# Altium footprint library FCI THD.PcbLib: 30 footprints (part 2 of 2)
Each footprint in its own frame and in the unit in brackets; x right, y up, seen from the top. Pads: shape width x height; smd on the part's side, far side on the other; paste and mask are expansions set on the pad; w line width, h text height; cw(c..) or ccw(c..) is an arc to the next point about the centre after c.
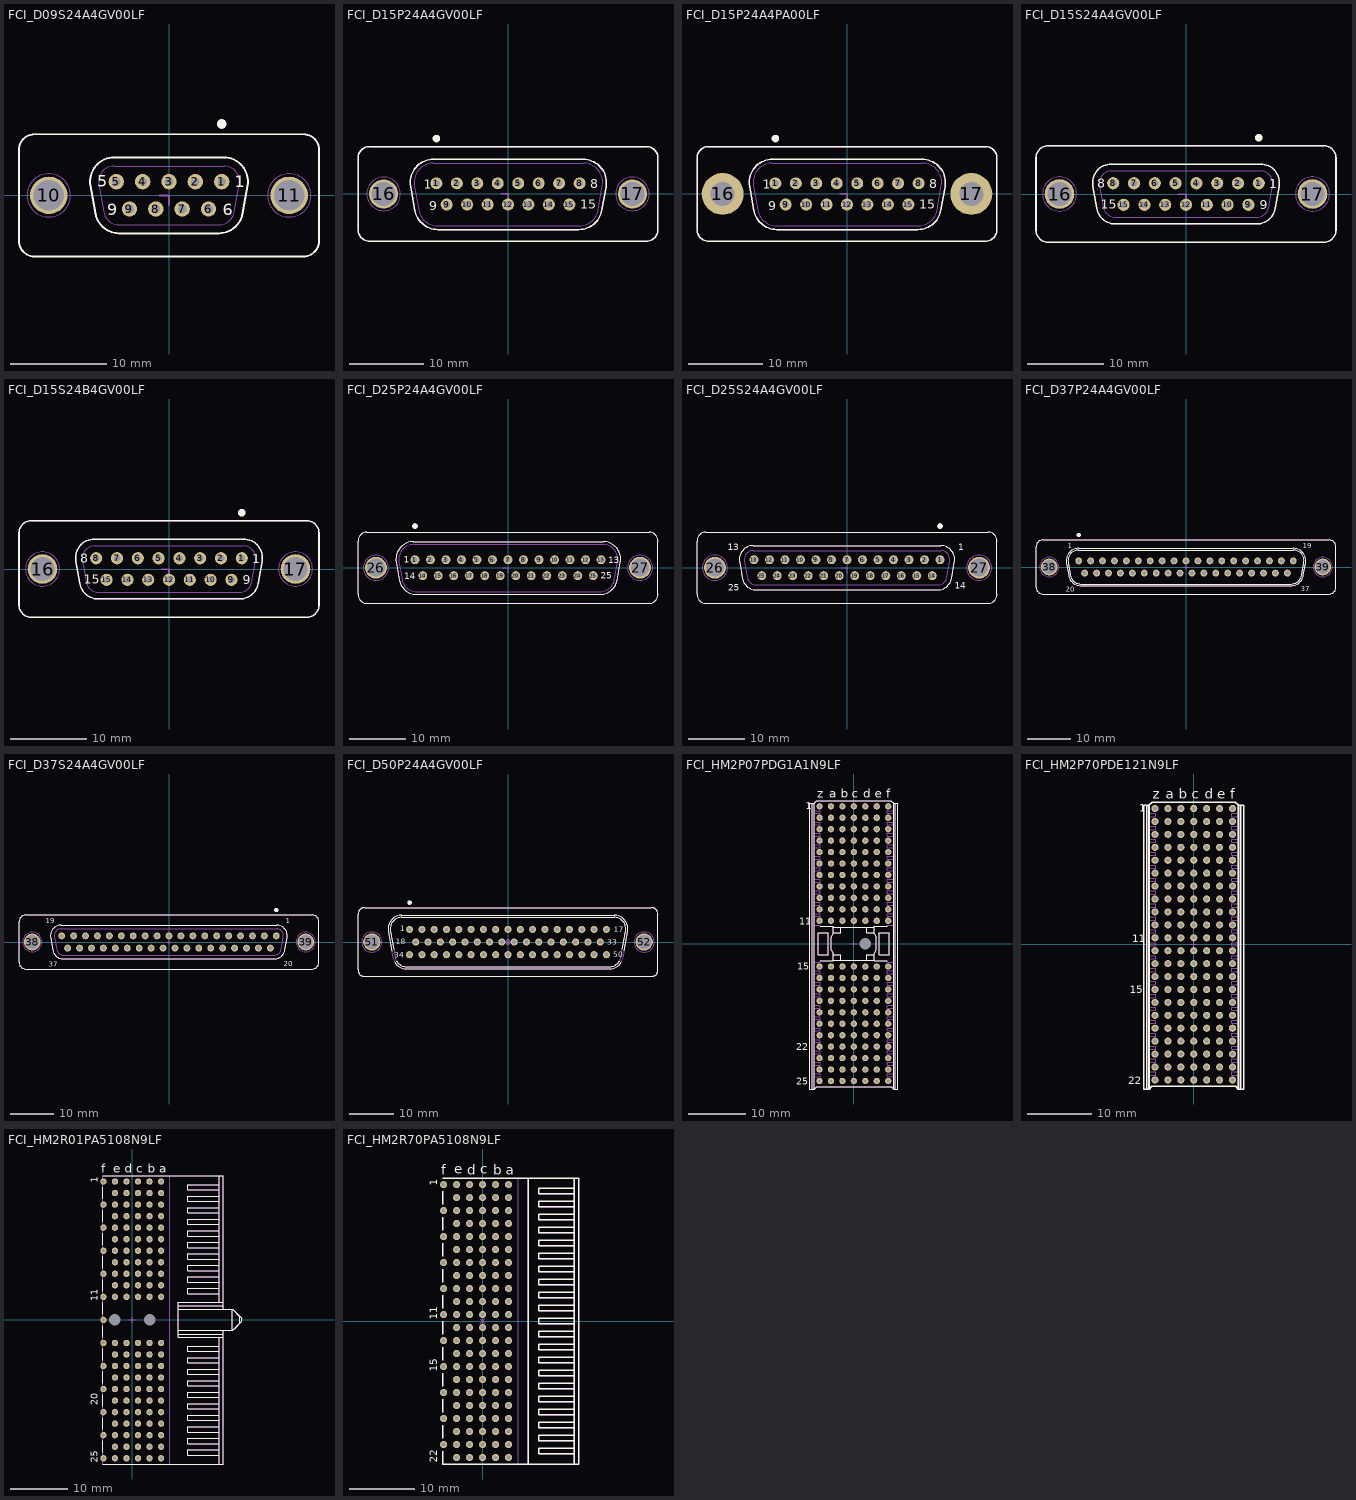
[diagram p1: the footprints below, top view; thin cyan lines are the x and y axes]

## FCI_D09S24A4GV00LF [mm] "Straight D-SUB 9 Female Contacts for PCB  with Harpoons and Female Screwlock (UNC4-40) and Elec. Continuity"
height 12.39
pads (11):
  round 1.6 hole 0.9: 1(5.48,1.42) 2(2.74,1.42) 3(0,1.42) 4(-2.74,1.42) 5(-5.48,1.42) 6(4.11,-1.42) 7(1.37,-1.42) 8(-1.37,-1.42) 9(-4.11,-1.42)
  round 3.9 hole 3.2: 10(-12.495,0) 11(12.495,0)
Top Overlay:
  circle w0.5: c5.48,7.42 r0.25
  lines w0.2: -15.595,-4.75 ccw(c-13.995,-4.75) -13.995,-6.35 13.995,-6.35 ccw(c13.995,-4.75) 15.595,-4.75 15.595,4.75 ccw(c13.995,4.75) 13.995,6.35 -13.995,6.35 ccw(c-13.995,4.75) -15.595,4.75 -15.595,-4.75 ; -8.167,1.011 cw(c-5.705,1.445) -5.705,3.945 5.705,3.945 cw(c5.705,1.445) 8.167,1.011 7.657,-1.879 cw(c5.195,-1.445) 5.195,-3.945 -5.195,-3.945 cw(c-5.195,-1.445) -7.657,-1.879 -8.167,1.011
  text "1" at 6.855,0.82 h1.2
  text "5" at -7.48,0.895 h1.2
  text "6" at 5.585,-2.045 h1.2
  text "9" at -6.41,-2.045 h1.2
Mechanical 8:
  lines w0.2: -1,0 0,0 0,-1
Mechanical 14:
  circle w0.1: c12.495,0 r2.25
  circle w0.1: c-12.495,0 r2.25
  lines w0.1: -15.595,-4.75 ccw(c-13.995,-4.75) -13.995,-6.35 13.995,-6.35 ccw(c13.995,-4.75) 15.595,-4.75 15.595,4.75 ccw(c13.995,4.75) 13.995,6.35 -13.995,6.35 ccw(c-13.995,4.75) -15.595,4.75 -15.595,-4.75 ; -8.167,1.011 cw(c-5.705,1.445) -5.705,3.945 5.705,3.945 cw(c5.705,1.445) 8.167,1.011 7.657,-1.879 cw(c5.195,-1.445) 5.195,-3.945 -5.195,-3.945 cw(c-5.195,-1.445) -7.657,-1.879 -8.167,1.011 ; -7.291,1.167 cw(c-5.715,1.445) -5.715,3.045 5.715,3.045 cw(c5.715,1.445) 7.291,1.167 6.781,-1.723 cw(c5.205,-1.445) 5.205,-3.045 -5.205,-3.045 cw(c-5.205,-1.445) -6.781,-1.723 -7.291,1.167
  text "9 D-Sub Female" at -6.178,4.472 h1.2
  text "9" at -9.5,-2.025 h1.2
  text "6" at 8.525,-2.05 h1.2
  text "5" at -9.525,1 h1.2
  text "1" at 8.85,1 h1.2
3D body "FCI_D09S24A4GV00LF.stp": height 12.1, standoff -3, extent -15.495,-6.653 15.495,6.21

## FCI_D15P24A4GV00LF [mm] "Straight D-SUB 15 Male Contacts for PCB  with Harpoons and Female Screwlock (UNC4-40) and Elec. Continuity"
height 12.25
pads (17):
  round 1.6 hole 0.9: 1(-9.59,1.42) 2(-6.85,1.42) 3(-4.11,1.42) 4(-1.37,1.42) 5(1.37,1.42) 6(4.11,1.42) 7(6.85,1.42) 8(9.59,1.42) 9(-8.22,-1.42) 10(-5.48,-1.42) 11(-2.74,-1.42) 12(0,-1.42) 13(2.74,-1.42) 14(5.48,-1.42) 15(8.22,-1.42)
  round 3.9 hole 3.2: 16(-16.66,0) 17(16.66,0)
Top Overlay:
  circle w0.5: c-9.59,7.42 r0.25
  lines w0.2: -20.095,-4.75 ccw(c-18.495,-4.75) -18.495,-6.35 18.495,-6.35 ccw(c18.495,-4.75) 20.095,-4.75 20.095,4.75 ccw(c18.495,4.75) 18.495,6.35 -18.495,6.35 ccw(c-18.495,4.75) -20.095,4.75 -20.095,-4.75 ; -13.038,0.978 cw(c-9.965,1.52) -9.965,4.64 10.065,4.64 cw(c10.065,1.52) 13.138,0.978 12.579,-2.192 cw(c9.506,-1.65) 9.506,-4.77 -9.406,-4.77 cw(c-9.406,-1.65) -12.479,-2.192 -13.038,0.978
  text "8" at 11.04,0.77 h1.2
  text "9" at -10.52,-2.17 h1.2
  text "1" at -11.29,0.67 h1.2
  text "15" at 9.695,-1.995 h1.2
Mechanical 8:
  lines w0.2: -1,0 0,0 0,-1
Mechanical 14:
  circle w0.1: c-16.66,0 r2.25
  circle w0.1: c16.66,0 r2.25
  lines w0.1: -20.095,-4.75 ccw(c-18.495,-4.75) -18.495,-6.35 18.495,-6.35 ccw(c18.495,-4.75) 20.095,-4.75 20.095,4.75 ccw(c18.495,4.75) 18.495,6.35 -18.495,6.35 ccw(c-18.495,4.75) -20.095,4.75 -20.095,-4.75 ; -13.038,0.978 cw(c-9.965,1.52) -9.965,4.64 10.065,4.64 cw(c10.065,1.52) 13.138,0.978 12.579,-2.192 cw(c9.506,-1.65) 9.506,-4.77 -9.406,-4.77 cw(c-9.406,-1.65) -12.479,-2.192 -13.038,0.978 ; -12.545,1.065 cw(c-9.965,1.52) -9.965,4.14 10.065,4.14 cw(c10.065,1.52) 12.645,1.065 12.086,-2.105 cw(c9.506,-1.65) 9.506,-4.27 -9.406,-4.27 cw(c-9.406,-1.65) -11.986,-2.105 -12.545,1.065
  text "15 D-Sub Male" at -6.028,4.847 h1.2
  text "15" at 9.695,-1.995 h1.2
  text "1" at -11.29,0.67 h1.2
  text "9" at -10.52,-2.17 h1.2
  text "8" at 11.04,0.77 h1.2
3D body "FCI_D15P24A4GV00LF.stp": height 12, standoff -3, extent -19.66,-6.275 19.66,6.275

## FCI_D15P24A4PA00LF [mm] "Straight D-SUB 15 Male Contacts for PCB  without Harpoons and without Female Screwlock"
height 12.25
pads (17):
  round 1.6 hole 0.9: 1(-9.59,1.42) 2(-6.85,1.42) 3(-4.11,1.42) 4(-1.37,1.42) 5(1.37,1.42) 6(4.11,1.42) 7(6.85,1.42) 8(9.59,1.42) 9(-8.22,-1.42) 10(-5.48,-1.42) 11(-2.74,-1.42) 12(0,-1.42) 13(2.74,-1.42) 14(5.48,-1.42) 15(8.22,-1.42)
  round 5.6 hole 3.2: 16(-16.66,0) 17(16.66,0)
Top Overlay:
  circle w0.5: c-9.59,7.42 r0.25
  lines w0.2: -20.095,-4.75 ccw(c-18.495,-4.75) -18.495,-6.35 18.495,-6.35 ccw(c18.495,-4.75) 20.095,-4.75 20.095,4.75 ccw(c18.495,4.75) 18.495,6.35 -18.495,6.35 ccw(c-18.495,4.75) -20.095,4.75 -20.095,-4.75 ; -13.038,0.978 cw(c-9.965,1.52) -9.965,4.64 10.065,4.64 cw(c10.065,1.52) 13.138,0.978 12.579,-2.192 cw(c9.506,-1.65) 9.506,-4.77 -9.406,-4.77 cw(c-9.406,-1.65) -12.479,-2.192 -13.038,0.978
  text "8" at 11.04,0.77 h1.2
  text "9" at -10.52,-2.17 h1.2
  text "1" at -11.29,0.67 h1.2
  text "15" at 9.695,-1.995 h1.2
Mechanical 8:
  lines w0.2: -1,0 0,0 0,-1
Mechanical 14:
  circle w0.1: c-16.66,0 r2.25
  circle w0.1: c16.66,0 r2.25
  lines w0.1: -20.095,-4.75 ccw(c-18.495,-4.75) -18.495,-6.35 18.495,-6.35 ccw(c18.495,-4.75) 20.095,-4.75 20.095,4.75 ccw(c18.495,4.75) 18.495,6.35 -18.495,6.35 ccw(c-18.495,4.75) -20.095,4.75 -20.095,-4.75 ; -13.038,0.978 cw(c-9.965,1.52) -9.965,4.64 10.065,4.64 cw(c10.065,1.52) 13.138,0.978 12.579,-2.192 cw(c9.506,-1.65) 9.506,-4.77 -9.406,-4.77 cw(c-9.406,-1.65) -12.479,-2.192 -13.038,0.978 ; -12.545,1.065 cw(c-9.965,1.52) -9.965,4.14 10.065,4.14 cw(c10.065,1.52) 12.645,1.065 12.086,-2.105 cw(c9.506,-1.65) 9.506,-4.27 -9.406,-4.27 cw(c-9.406,-1.65) -11.986,-2.105 -12.545,1.065
  text "15 D-Sub Male" at -6.028,4.847 h1.2
  text "15" at 9.695,-1.995 h1.2
  text "1" at -11.29,0.67 h1.2
  text "9" at -10.52,-2.17 h1.2
  text "8" at 11.04,0.77 h1.2
3D body "FCI_D15P24A4PA00LF.stp": height 11.9, standoff -2, extent -19.66,-6.275 19.66,6.275

## FCI_D15S24A4GV00LF [mm] "Straight D-SUB 15 Female Contacts for PCB  with Harpoons and Female Screwlock (UNC4-40) and Elec. Continuity"
height 12.39
pads (17):
  round 1.6 hole 0.9: 1(9.59,1.42) 2(6.85,1.42) 3(4.11,1.42) 4(1.37,1.42) 5(-1.37,1.42) 6(-4.11,1.42) 7(-6.85,1.42) 8(-9.59,1.42) 9(8.22,-1.42) 10(5.48,-1.42) 11(2.74,-1.42) 12(0,-1.42) 13(-2.74,-1.42) 14(-5.48,-1.42) 15(-8.22,-1.42)
  round 3.9 hole 3.2: 16(-16.66,0) 17(16.66,0)
Top Overlay:
  circle w0.5: c9.59,7.42 r0.25
  lines w0.2: -19.76,-4.75 ccw(c-18.16,-4.75) -18.16,-6.35 18.16,-6.35 ccw(c18.16,-4.75) 19.76,-4.75 19.76,4.75 ccw(c18.16,4.75) 18.16,6.35 -18.16,6.35 ccw(c-18.16,4.75) -19.76,4.75 -19.76,-4.75 ; -12.277,1.011 cw(c-9.815,1.445) -9.815,3.945 9.815,3.945 cw(c9.815,1.445) 12.277,1.011 11.767,-1.879 cw(c9.305,-1.445) 9.305,-3.945 -9.305,-3.945 cw(c-9.305,-1.445) -11.767,-1.879 -12.277,1.011
  text "15" at -11.22,-1.945 h1.2
  text "8" at -11.69,0.82 h1.2
  text "1" at 10.965,0.77 h1.2
  text "9" at 9.695,-1.995 h1.2
Mechanical 8:
  lines w0.2: -1,0 0,0 0,-1
Mechanical 14:
  circle w0.1: c16.66,0 r2.25
  circle w0.1: c-16.66,0 r2.25
  lines w0.1: -19.76,-4.75 ccw(c-18.16,-4.75) -18.16,-6.35 18.16,-6.35 ccw(c18.16,-4.75) 19.76,-4.75 19.76,4.75 ccw(c18.16,4.75) 18.16,6.35 -18.16,6.35 ccw(c-18.16,4.75) -19.76,4.75 -19.76,-4.75 ; -12.277,1.011 cw(c-9.815,1.445) -9.815,3.945 9.815,3.945 cw(c9.815,1.445) 12.277,1.011 11.767,-1.879 cw(c9.305,-1.445) 9.305,-3.945 -9.305,-3.945 cw(c-9.305,-1.445) -11.767,-1.879 -12.277,1.011 ; -11.401,1.167 cw(c-9.825,1.445) -9.825,3.045 9.825,3.045 cw(c9.825,1.445) 11.401,1.167 10.891,-1.723 cw(c9.315,-1.445) 9.315,-3.045 -9.315,-3.045 cw(c-9.315,-1.445) -10.891,-1.723 -11.401,1.167
  text "15 D-Sub Female" at -6.278,4.522 h1.2
  text "9" at 12.845,-2.07 h1.2
  text "1" at 12.99,1.095 h1.2
  text "8" at -13.715,0.945 h1.2
  text "15" at -14.17,-2.045 h1.2
3D body "FCI_D15S24A4GV00LF.stp": height 12.1, standoff -3, extent -19.66,-6.275 19.66,6.275

## FCI_D15S24B4GV00LF [mm] "Straight D-SUB 15 Female Contacts for PCB  with Harpoons and Female Screwlock (UNC4-40) and Elec. Continuity"
height 12.39
pads (17):
  round 1.6 hole 0.9: 1(9.59,1.42) 2(6.85,1.42) 3(4.11,1.42) 4(1.37,1.42) 5(-1.37,1.42) 6(-4.11,1.42) 7(-6.85,1.42) 8(-9.59,1.42) 9(8.22,-1.42) 10(5.48,-1.42) 11(2.74,-1.42) 12(0,-1.42) 13(-2.74,-1.42) 14(-5.48,-1.42) 15(-8.22,-1.42)
  round 3.9 hole 3.2: 16(-16.66,0) 17(16.66,0)
Top Overlay:
  circle w0.5: c9.59,7.42 r0.25
  lines w0.2: -19.76,-4.75 ccw(c-18.16,-4.75) -18.16,-6.35 18.16,-6.35 ccw(c18.16,-4.75) 19.76,-4.75 19.76,4.75 ccw(c18.16,4.75) 18.16,6.35 -18.16,6.35 ccw(c-18.16,4.75) -19.76,4.75 -19.76,-4.75 ; -12.277,1.011 cw(c-9.815,1.445) -9.815,3.945 9.815,3.945 cw(c9.815,1.445) 12.277,1.011 11.767,-1.879 cw(c9.305,-1.445) 9.305,-3.945 -9.305,-3.945 cw(c-9.305,-1.445) -11.767,-1.879 -12.277,1.011
  text "15" at -11.22,-1.945 h1.2
  text "8" at -11.69,0.82 h1.2
  text "1" at 10.965,0.77 h1.2
  text "9" at 9.695,-1.995 h1.2
Mechanical 8:
  lines w0.2: -1,0 0,0 0,-1
Mechanical 14:
  circle w0.1: c16.66,0 r2.25
  circle w0.1: c-16.66,0 r2.25
  lines w0.1: -19.76,-4.75 ccw(c-18.16,-4.75) -18.16,-6.35 18.16,-6.35 ccw(c18.16,-4.75) 19.76,-4.75 19.76,4.75 ccw(c18.16,4.75) 18.16,6.35 -18.16,6.35 ccw(c-18.16,4.75) -19.76,4.75 -19.76,-4.75 ; -12.277,1.011 cw(c-9.815,1.445) -9.815,3.945 9.815,3.945 cw(c9.815,1.445) 12.277,1.011 11.767,-1.879 cw(c9.305,-1.445) 9.305,-3.945 -9.305,-3.945 cw(c-9.305,-1.445) -11.767,-1.879 -12.277,1.011 ; -11.401,1.167 cw(c-9.825,1.445) -9.825,3.045 9.825,3.045 cw(c9.825,1.445) 11.401,1.167 10.891,-1.723 cw(c9.315,-1.445) 9.315,-3.045 -9.315,-3.045 cw(c-9.315,-1.445) -10.891,-1.723 -11.401,1.167
  text "15 D-Sub Female" at -6.278,4.522 h1.2
  text "9" at 12.845,-2.07 h1.2
  text "1" at 12.99,1.095 h1.2
  text "8" at -13.715,0.945 h1.2
  text "15" at -14.17,-2.045 h1.2
3D body "FCI_D15S24B4GV00LF.stp": height 12.1, standoff -4, extent -19.66,-6.275 19.66,6.275

## FCI_D25P24A4GV00LF [mm] "Straight D-SUB 25 Male Contacts for PCB  with Harpoons and Female Screwlock (UNC4-40) and Elec. Continuity"
height 12.05
pads (27):
  round 1.6 hole 0.9: 1(-16.56,1.42) 2(-13.8,1.42) 3(-11.04,1.42) 4(-8.28,1.42) 5(-5.52,1.42) 6(-2.76,1.42) 7(0,1.42) 8(2.76,1.42) 9(5.52,1.42) 10(8.28,1.42) 11(11.04,1.42) 12(13.8,1.42) 13(16.56,1.42) 14(-15.18,-1.42) 15(-12.42,-1.42) 16(-9.66,-1.42) 17(-6.9,-1.42) 18(-4.14,-1.42) 19(-1.38,-1.42) 20(1.38,-1.42) 21(4.14,-1.42) 22(6.9,-1.42) 23(9.66,-1.42) 24(12.42,-1.42) 25(15.18,-1.42)
  round 3.9 hole 3.2: 26(-23.52,0) 27(23.52,0)
Top Overlay:
  circle w0.5: c-16.56,7.42 r0.25
  lines w0.2: -26.705,-4.75 ccw(c-25.105,-4.75) -25.105,-6.35 25.105,-6.35 ccw(c25.105,-4.75) 26.705,-4.75 26.705,4.75 ccw(c25.105,4.75) 25.105,6.35 -25.105,6.35 ccw(c-25.105,4.75) -26.705,4.75 -26.705,-4.75 ; -19.903,0.978 cw(c-16.83,1.52) -16.83,4.64 16.93,4.64 cw(c16.93,1.52) 20.003,0.978 19.444,-2.192 cw(c16.371,-1.65) 16.371,-4.77 -16.271,-4.77 cw(c-16.271,-1.65) -19.344,-2.192 -19.903,0.978
  text "14" at -18.475,-2.05 h1.2
  text "13" at 17.825,0.825 h1.2
  text "1" at -18.575,0.85 h1.2
  text "25" at 16.55,-1.925 h1.2
Mechanical 8:
  lines w0.2: -1,0 0,0 0,-1
Mechanical 14:
  circle w0.1: c-23.52,0 r2.25
  circle w0.1: c23.52,0 r2.25
  lines w0.1: -26.705,-4.75 ccw(c-25.105,-4.75) -25.105,-6.35 25.105,-6.35 ccw(c25.105,-4.75) 26.705,-4.75 26.705,4.75 ccw(c25.105,4.75) 25.105,6.35 -25.105,6.35 ccw(c-25.105,4.75) -26.705,4.75 -26.705,-4.75 ; -19.903,0.978 cw(c-16.83,1.52) -16.83,4.64 16.93,4.64 cw(c16.93,1.52) 20.003,0.978 19.444,-2.192 cw(c16.371,-1.65) 16.371,-4.77 -16.271,-4.77 cw(c-16.271,-1.65) -19.344,-2.192 -19.903,0.978 ; -19.41,1.065 cw(c-16.83,1.52) -16.83,4.14 16.93,4.14 cw(c16.93,1.52) 19.51,1.065 18.951,-2.105 cw(c16.371,-1.65) 16.371,-4.27 -16.271,-4.27 cw(c-16.271,-1.65) -18.851,-2.105 -19.41,1.065
  text "25" at 16.55,-1.925 h1.2
  text "1" at -18.575,0.85 h1.2
  text "13" at 17.5,0.875 h1.2
  text "14" at -18.475,-2.05 h1.2
  text "25 D-Sub Male" at -6.478,4.872 h1.2
3D body "FCI_D25P24A4GV00LF.stp": height 12, standoff -3, extent -26.52,-6.275 26.52,6.275

## FCI_D25S24A4GV00LF [mm] "Straight D-SUB 25 Female Contacts for PCB  with Harpoons and Female Screwlock (UNC4-40) and Elec. Continuity"
height 12.39
pads (27):
  round 1.6 hole 0.9: 1(16.56,1.42) 2(13.8,1.42) 3(11.04,1.42) 4(8.28,1.42) 5(5.52,1.42) 6(2.76,1.42) 7(0,1.42) 8(-2.76,1.42) 9(-5.52,1.42) 10(-8.28,1.42) 11(-11.04,1.42) 12(-13.8,1.42) 13(-16.56,1.42) 14(15.18,-1.42) 15(12.42,-1.42) 16(9.66,-1.42) 17(6.9,-1.42) 18(4.14,-1.42) 19(1.38,-1.42) 20(-1.38,-1.42) 21(-4.14,-1.42) 22(-6.9,-1.42) 23(-9.66,-1.42) 24(-12.42,-1.42) 25(-15.18,-1.42)
  round 3.9 hole 3.2: 26(-23.52,0) 27(23.52,0)
Top Overlay:
  circle w0.5: c16.56,7.42 r0.25
  lines w0.2: -26.705,-4.75 ccw(c-25.105,-4.75) -25.105,-6.35 25.105,-6.35 ccw(c25.105,-4.75) 26.705,-4.75 26.705,4.75 ccw(c25.105,4.75) 25.105,6.35 -25.105,6.35 ccw(c-25.105,4.75) -26.705,4.75 -26.705,-4.75 ; -19.137,1.011 cw(c-16.675,1.445) -16.675,3.945 16.675,3.945 cw(c16.675,1.445) 19.137,1.011 18.627,-1.879 cw(c16.165,-1.445) 16.165,-3.945 -16.165,-3.945 cw(c-16.165,-1.445) -18.627,-1.879 -19.137,1.011
  text "13" at -21.225,3.125 h1.2
  text "1" at 19.775,3.1 h1.2
  text "14" at 19.2,-3.75 h1.2
  text "25" at -21.1,-4.1 h1.2
Mechanical 8:
  lines w0.2: -1,0 0,0 0,-1
Mechanical 14:
  circle w0.1: c23.52,0 r2.25
  circle w0.1: c-23.52,0 r2.25
  lines w0.1: -26.705,-4.75 ccw(c-25.105,-4.75) -25.105,-6.35 25.105,-6.35 ccw(c25.105,-4.75) 26.705,-4.75 26.705,4.75 ccw(c25.105,4.75) 25.105,6.35 -25.105,6.35 ccw(c-25.105,4.75) -26.705,4.75 -26.705,-4.75 ; -19.137,1.011 cw(c-16.675,1.445) -16.675,3.945 16.675,3.945 cw(c16.675,1.445) 19.137,1.011 18.627,-1.879 cw(c16.165,-1.445) 16.165,-3.945 -16.165,-3.945 cw(c-16.165,-1.445) -18.627,-1.879 -19.137,1.011 ; -18.261,1.167 cw(c-16.685,1.445) -16.685,3.045 16.685,3.045 cw(c16.685,1.445) 18.261,1.167 17.751,-1.723 cw(c16.175,-1.445) 16.175,-3.045 -16.175,-3.045 cw(c-16.175,-1.445) -17.751,-1.723 -18.261,1.167
  text "25 D-Sub Female" at -6.328,4.497 h1.2
  text "25" at -21.1,-4.1 h1.2
  text "14" at 19.2,-3.75 h1.2
  text "1" at 19.775,3.1 h1.2
  text "13" at -21.225,3.125 h1.2
3D body "FCI_D25S24A4GV00LF.stp": height 12.1, standoff -3, extent -26.52,-6.275 26.52,6.275

## FCI_D37P24A4GV00LF [mm] "Straight D-SUB 37 Male Contacts for PCB  with Harpoons and Female Screwlock (UNC4-40) and Elec. Continuity"
height 12.05
pads (39):
  round 1.6 hole 0.9: 1(-24.93,1.42) 2(-22.16,1.42) 3(-19.39,1.42) 4(-16.62,1.42) 5(-13.85,1.42) 6(-11.08,1.42) 7(-8.31,1.42) 8(-5.54,1.42) 9(-2.77,1.42) 10(0,1.42) 11(2.77,1.42) 12(5.54,1.42) 13(8.31,1.42) 14(11.08,1.42) 15(13.85,1.42) 16(16.62,1.42) 17(19.39,1.42) 18(22.16,1.42) 19(24.93,1.42) 20(-23.545,-1.42) 21(-20.775,-1.42) 22(-18.005,-1.42) 23(-15.235,-1.42) 24(-12.465,-1.42) 25(-9.695,-1.42) 26(-6.925,-1.42) 27(-4.155,-1.42) 28(-1.385,-1.42) 29(1.385,-1.42) 30(4.155,-1.42) 31(6.925,-1.42) 32(9.695,-1.42) 33(12.465,-1.42) 34(15.235,-1.42) 35(18.005,-1.42) 36(20.775,-1.42) 37(23.545,-1.42)
  round 3.9 hole 3.2: 38(-31.75,0) 39(31.75,0)
Top Overlay:
  circle w0.5: c-24.93,7.42 r0.25
  lines w0.2: -34.85,-4.675 ccw(c-33.25,-4.675) -33.25,-6.275 33.25,-6.275 ccw(c33.25,-4.675) 34.85,-4.675 34.85,4.675 ccw(c33.25,4.675) 33.25,6.275 -33.25,6.275 ccw(c-33.25,4.675) -34.85,4.675 -34.85,-4.675 ; -27.776,0.946 cw(c-24.92,1.45) -24.92,4.35 24.92,4.35 cw(c24.92,1.45) 27.776,0.946 27.265,-1.954 cw(c24.409,-1.45) 24.409,-4.35 -24.409,-4.35 cw(c-24.409,-1.45) -27.265,-1.954 -27.776,0.946 ; -27.382,1.016 cw(c-24.92,1.45) -24.92,3.95 24.92,3.95 cw(c24.92,1.45) 27.382,1.016 26.871,-1.884 cw(c24.409,-1.45) 24.409,-3.95 -24.409,-3.95 cw(c-24.409,-1.45) -26.871,-1.884 -27.382,1.016
  text "20" at -27.97,-5.692 h1.2
  text "1" at -27.475,4.393 h1.2
  text "19" at 27.093,4.393 h1.2
  text "37" at 26.609,-5.64 h1.2
Mechanical 8:
  drawing of 160 lines, arcs and shapes, not listed
Mechanical 14:
  circle w0.1: c-31.75,0 r2.25
  circle w0.1: c31.75,0 r2.25
  lines w0.1: -34.85,-4.675 ccw(c-33.25,-4.675) -33.25,-6.275 33.25,-6.275 ccw(c33.25,-4.675) 34.85,-4.675 34.85,4.675 ccw(c33.25,4.675) 33.25,6.275 -33.25,6.275 ccw(c-33.25,4.675) -34.85,4.675 -34.85,-4.675 ; -27.776,0.946 cw(c-24.92,1.45) -24.92,4.35 24.92,4.35 cw(c24.92,1.45) 27.776,0.946 27.265,-1.954 cw(c24.409,-1.45) 24.409,-4.35 -24.409,-4.35 cw(c-24.409,-1.45) -27.265,-1.954 -27.776,0.946 ; -27.382,1.016 cw(c-24.92,1.45) -24.92,3.95 24.92,3.95 cw(c24.92,1.45) 27.382,1.016 26.871,-1.884 cw(c24.409,-1.45) 24.409,-3.95 -24.409,-3.95 cw(c-24.409,-1.45) -26.871,-1.884 -27.382,1.016
  text "37" at 26.609,-5.64 h1.2
  text "19" at 27.093,4.393 h1.2
  text "1" at -27.475,4.393 h1.2
  text "20" at -27.97,-5.692 h1.2
  text "37 D-Sub Male" at -8.078,4.697 h1.2
3D body "FCI_D37P24A4GV00LF.stp": height 12, standoff -3.2, extent -34.85,-6.275 34.85,6.275

## FCI_D37S24A4GV00LF [mm] "Straight D-SUB 37 Female Contacts for PCB  with Harpoons and Female Screwlock (UNC4-40) and Elec. Continuity"
height 12.39
pads (39):
  round 1.6 hole 0.9: 1(24.93,1.42) 2(22.16,1.42) 3(19.39,1.42) 4(16.62,1.42) 5(13.85,1.42) 6(11.08,1.42) 7(8.31,1.42) 8(5.54,1.42) 9(2.77,1.42) 10(0,1.42) 11(-2.77,1.42) 12(-5.54,1.42) 13(-8.31,1.42) 14(-11.08,1.42) 15(-13.85,1.42) 16(-16.62,1.42) 17(-19.39,1.42) 18(-22.16,1.42) 19(-24.93,1.42) 20(23.545,-1.42) 21(20.775,-1.42) 22(18.005,-1.42) 23(15.235,-1.42) 24(12.465,-1.42) 25(9.695,-1.42) 26(6.925,-1.42) 27(4.155,-1.42) 28(1.385,-1.42) 29(-1.385,-1.42) 30(-4.155,-1.42) 31(-6.925,-1.42) 32(-9.695,-1.42) 33(-12.465,-1.42) 34(-15.235,-1.42) 35(-18.005,-1.42) 36(-20.775,-1.42) 37(-23.545,-1.42)
  round 3.9 hole 3.2: 38(-31.75,0) 39(31.75,0)
Top Overlay:
  circle w0.5: c24.93,7.42 r0.25
  lines w0.2: -34.85,-4.675 ccw(c-33.25,-4.675) -33.25,-6.275 33.25,-6.275 ccw(c33.25,-4.675) 34.85,-4.675 34.85,4.675 ccw(c33.25,4.675) 33.25,6.275 -33.25,6.275 ccw(c-33.25,4.675) -34.85,4.675 -34.85,-4.675 ; -27.502,1.011 cw(c-25.04,1.445) -25.04,3.945 24.985,3.945 cw(c24.985,1.445) 27.447,1.011 26.937,-1.879 cw(c24.475,-1.445) 24.475,-3.945 -24.53,-3.945 cw(c-24.53,-1.445) -26.992,-1.879 -27.502,1.011
  text "20" at 26.609,-5.64 h1.2
  text "1" at 27.093,4.393 h1.2
  text "19" at -28.65,4.4 h1.2
  text "37" at -27.97,-5.692 h1.2
Mechanical 8:
  drawing of 160 lines, arcs and shapes, not listed
Mechanical 14:
  circle w0.1: c31.75,0 r2.25
  circle w0.1: c-31.75,0 r2.25
  lines w0.1: -34.85,-4.675 ccw(c-33.25,-4.675) -33.25,-6.275 33.25,-6.275 ccw(c33.25,-4.675) 34.85,-4.675 34.85,4.675 ccw(c33.25,4.675) 33.25,6.275 -33.25,6.275 ccw(c-33.25,4.675) -34.85,4.675 -34.85,-4.675 ; -27.502,1.011 cw(c-25.04,1.445) -25.04,3.945 24.985,3.945 cw(c24.985,1.445) 27.447,1.011 26.937,-1.879 cw(c24.475,-1.445) 24.475,-3.945 -24.53,-3.945 cw(c-24.53,-1.445) -26.992,-1.879 -27.502,1.011 ; -26.626,1.167 cw(c-25.05,1.445) -25.05,3.045 24.995,3.045 cw(c24.995,1.445) 26.571,1.167 26.061,-1.723 cw(c24.485,-1.445) 24.485,-3.045 -24.54,-3.045 cw(c-24.54,-1.445) -26.116,-1.723 -26.626,1.167
  text "37 D-Sub Female" at -8.078,4.697 h1.2
  text "37" at -27.97,-5.692 h1.2
  text "19" at -28.65,4.4 h1.2
  text "1" at 27.093,4.393 h1.2
  text "20" at 26.609,-5.64 h1.2
3D body "FCI_D37S24A4GV00LF.stp": height 12.1, standoff -3.2, extent -34.85,-6.275 34.85,6.275

## FCI_D50P24A4GV00LF [mm] "Straight D-SUB 50 Male Contacts for PCB  with Harpoons and Female Screwlock (UNC4-40) and Elec. Continuity"
height 12.3
pads (52):
  round 1.6 hole 0.9: 1(-22.08,2.84) 2(-19.32,2.84) 3(-16.56,2.84) 4(-13.8,2.84) 5(-11.04,2.84) 6(-8.28,2.84) 7(-5.52,2.84) 8(-2.76,2.84) 9(0,2.84) 10(2.76,2.84) 11(5.52,2.84) 12(8.28,2.84) 13(11.04,2.84) 14(13.8,2.84) 15(16.56,2.84) 16(19.32,2.84) 17(22.08,2.84) 18(-20.7,0) 19(-17.94,0) 20(-15.18,0) 21(-12.42,0) 22(-9.66,0) 23(-6.9,0) 24(-4.14,0) 25(-1.38,0) 26(1.38,0) 27(4.14,0) 28(6.9,0) 29(9.66,0) 30(12.42,0) 31(15.18,0) 32(17.94,0) 33(20.7,0) 34(-22.08,-2.84) 35(-19.32,-2.84) 36(-16.56,-2.84) 37(-13.8,-2.84) 38(-11.04,-2.84) 39(-8.28,-2.84) 40(-5.52,-2.84) 41(-2.76,-2.84) 42(0,-2.84) 43(2.76,-2.84) 44(5.52,-2.84) 45(8.28,-2.84) 46(11.04,-2.84) 47(13.8,-2.84) 48(16.56,-2.84) 49(19.32,-2.84) 50(22.08,-2.84)
  round 3.9 hole 3.2: 51(-30.55,0) 52(30.55,0)
Top Overlay:
  circle w0.5: c-22.08,8.84 r0.25
  lines w0.2: -26.063,-2.11 -26.858,2.397 cw(c-23.805,2.935) -23.805,6.035 23.805,6.035 cw(c23.805,2.935) 26.858,2.397 26.082,-2.004 ; -25.647,-1.592 -26.366,2.484 cw(c-23.805,2.935) -23.805,5.535 23.805,5.535 cw(c23.805,2.935) 26.366,2.484 25.65,-1.575 ; -25.455,-4.485 ccw(c-22.77,-2.935) -22.77,-6.035 22.77,-6.035 ccw(c22.77,-2.935) 25.455,-4.485 ; -25.022,-4.235 ccw(c-22.77,-2.935) -22.77,-5.535 22.77,-5.535 ccw(c22.77,-2.935) 25.022,-4.235 ; -33.655,-6.23 ccw(c-32.155,-6.23) -32.155,-7.73 32.155,-7.73 ccw(c32.155,-6.23) 33.655,-6.23 33.655,6.23 ccw(c32.155,6.23) 32.155,7.73 -32.155,7.73 ccw(c-32.155,6.23) -33.655,6.23 -33.655,-6.23
  text "18" at -25.15,-0.55 h1.2
  text "34" at -25.515,-3.56 h1.2
  text "50" at 23.6,-3.45 h1.2
  text "33" at 22.275,-0.575 h1.2
  text "1" at -24.225,2.4 h1.2
  text "17" at 23.685,2.25 h1.2
Mechanical 8:
  drawing of 213 lines, arcs and shapes, not listed
Mechanical 14:
  circle w0.1: c-30.55,0 r2.25
  circle w0.1: c30.55,0 r2.25
  lines w0.1: -33.655,-6.23 ccw(c-32.155,-6.23) -32.155,-7.73 32.155,-7.73 ccw(c32.155,-6.23) 33.655,-6.23 33.655,6.23 ccw(c32.155,6.23) 32.155,7.73 -32.155,7.73 ccw(c-32.155,6.23) -33.655,6.23 -33.655,-6.23 ; -26.858,2.397 cw(c-23.805,2.935) -23.805,6.035 23.805,6.035 cw(c23.805,2.935) 26.858,2.397 25.823,-3.473 cw(c22.77,-2.935) 22.77,-6.035 -22.77,-6.035 cw(c-22.77,-2.935) -25.823,-3.473 -26.858,2.397 ; -26.366,2.484 cw(c-23.805,2.935) -23.805,5.535 23.805,5.535 cw(c23.805,2.935) 26.366,2.484 25.33,-3.386 cw(c22.77,-2.935) 22.77,-5.535 -22.77,-5.535 cw(c-22.77,-2.935) -25.33,-3.386 -26.366,2.484
  text "1" at -24.225,2.4 h1.2
  text "33" at 22.275,-0.575 h1.2
  text "50" at 23.6,-3.45 h1.2
  text "34" at -25.515,-3.56 h1.2
  text "18" at -25.15,-0.55 h1.2
  text "50 D-Sub Male" at -8.053,6.247 h1.2
  text "17" at 23.685,2.25 h1.2
3D body "FCI_D50P24A4GV00LF.stp": height 12, standoff -3.2, extent -33.655,-7.73 33.655,7.73

## FCI_HM2P07PDG1A1N9LF [mm] "110+44 Contacts, 22 positions  in Two Parts x 5 Rows  (a,b,c,d,e) + 2  Rows (z,f), Pitch 2 mm,  Press-Fit, Straight Hard Metric Male Connector, Millipacs, Type A"
height 13.6
pads (155):
  round 1.1 hole 0.6: a1(-4,24) a2(-4,22) a3(-4,20) a4(-4,18) a5(-4,16) a6(-4,14) a7(-4,12) a8(-4,10) a9(-4,8) a10(-4,6) a11(-4,4) a15(-4,-4) a16(-4,-6) a17(-4,-8) a18(-4,-10) a19(-4,-12) a20(-4,-14) a21(-4,-16) a22(-4,-18) a23(-4,-20) a24(-4,-22) a25(-4,-24) b1(-2,24) b2(-2,22) b3(-2,20) b4(-2,18) b5(-2,16) b6(-2,14) b7(-2,12) b8(-2,10) b9(-2,8) b10(-2,6) b11(-2,4) b15(-2,-4) b16(-2,-6) b17(-2,-8) b18(-2,-10) b19(-2,-12) b20(-2,-14) b21(-2,-16) b22(-2,-18) b23(-2,-20) b24(-2,-22) b25(-2,-24) c1(0,24) c2(0,22) c3(0,20) c4(0,18) c5(0,16) c6(0,14) c7(0,12) c8(0,10) c9(0,8) c10(0,6) c11(0,4) c15(0,-4) c16(0,-6) c17(0,-8) c18(0,-10) c19(0,-12) c20(0,-14) c21(0,-16) c22(0,-18) c23(0,-20) c24(0,-22) c25(0,-24) d1(2,24) d2(2,22) d3(2,20) d4(2,18) d5(2,16) d6(2,14) d7(2,12) d8(2,10) d9(2,8) d10(2,6) d11(2,4) d15(2,-4) d16(2,-6) d17(2,-8) d18(2,-10) d19(2,-12) d20(2,-14) d21(2,-16) d22(2,-18) d23(2,-20) d24(2,-22) d25(2,-24) e1(4,24) e2(4,22) e3(4,20) e4(4,18) e5(4,16) e6(4,14) e7(4,12) e8(4,10) e9(4,8) e10(4,6) e11(4,4) e15(4,-4) e16(4,-6) e17(4,-8) e18(4,-10) e19(4,-12) e20(4,-14) e21(4,-16) e22(4,-18) e23(4,-20) e24(4,-22) e25(4,-24) f1(6,24) f2(6,22) f3(6,20) f4(6,18) f5(6,16) f6(6,14) f7(6,12) f8(6,10) f9(6,8) f10(6,6) f11(6,4) f15(6,-4) f16(6,-6) f17(6,-8) f18(6,-10) f19(6,-12) f20(6,-14) f21(6,-16) f22(6,-18) f23(6,-20) f24(6,-22) f25(6,-24) z1(-6,24) z2(-6,22) z3(-6,20) z4(-6,18) z5(-6,16) z6(-6,14) z7(-6,12) z8(-6,10) z9(-6,8) z10(-6,6) z11(-6,4) z15(-6,-4) z16(-6,-6) z17(-6,-8) z18(-6,-10) z19(-6,-12) z20(-6,-14) z21(-6,-16) z22(-6,-18) z23(-6,-20) z24(-6,-21.998) z25(-6,-24)
  round 1 hole 2 unplated mask+0.5: MECH1(2,0)
Top Overlay:
  lines w0.2: -7.25,-25.4 -7.25,24.5 ; -6.9,24.55 -6.9,-25.4 ; -5.85,-3 -3.6,-3 -3.6,-2.9 ; -5.85,3 -3.6,3 -3.6,2.9 ; -3.6,-1.9 -2.25,-1.9 -2.25,-2.9 ; -3.6,1.9 -2.25,1.9 -2.25,2.9 ; 2.25,-2.9 2.25,-1.9 3.6,-1.9 ; 2.25,2.9 2.25,1.9 3.6,1.9 ; 5.85,-3 3.6,-3 3.6,-2.9 ; 5.85,3 3.6,3 3.6,2.9 ; 7.25,-25.4 7.25,24.5 ; -6.9,-25.4 -6.5,-25 6.55,-25 6.95,-25.4 ; -6.9,-25.4 -7.7,-25.4 -7.7,24.5 -6.95,24.5 -6.45,25 6.45,25 6.95,24.5 ; -3.6,-2.9 -3.6,-1.731 -3.95,-1.125 -3.95,1.125 -3.6,1.731 -3.6,2.9 ; -3.6,-2.9 3.6,-2.9 ; -3.6,2.9 3.6,2.9 ; 3.6,-2.9 3.6,-1.9 ; 3.6,-1.9 3.6,-1.731 3.95,-1.125 3.95,1.125 3.6,1.731 3.6,2.9 ; 6.95,-25.4 6.95,24.5 ; 6.95,-25.4 7.7,-25.4 7.7,24.5 6.95,24.5 ; -6.2,-1.9 -4.475,-1.9 -4.475,1.9 -6.2,1.9 -6.2,-1.9 ; 4.475,-1.9 6.2,-1.9 6.2,1.9 4.475,1.9 4.475,-1.9
  text "15" at -9.925,-4.558 h1.2
  text "22" at -10.1,-18.661 h1.2
  text "1" at -8.45,23.475 h1.2
  text "11" at -9.525,3.342 h1.2
  text "z" at -6.363,25.525 h1.5
  text "f" at 5.637,25.5 h1.5
  text "e" at 3.692,25.517 h1.5
  text "d" at 1.667,25.5 h1.5
  text "c" at -0.333,25.517 h1.5
  text "b" at -2.333,25.5 h1.5
  text "a" at -4.333,25.517 h1.5
  text "25" at -10.1,-24.661 h1.2
Mechanical 8:
  drawing of 624 lines, arcs and shapes, not listed
Mechanical 14:
  drawing of 798 lines, arcs and shapes, not listed
  text "15" at -9.925,-4.558 h1.2
  text "22" at -10.1,-18.661 h1.2
  text "11" at -9.525,3.342 h1.2
  text "1" at -8.45,23.475 h1.2
  text "z" at -6.363,25.525 h1.5
  text "f" at 5.637,25.5 h1.5
  text "e" at 3.692,25.517 h1.5
  text "d" at 1.667,25.5 h1.5
  text "c" at -0.333,25.517 h1.5
  text "b" at -2.333,25.5 h1.5
  text "a" at -4.333,25.517 h1.5
  text "25" at -10.1,-24.661 h1.2
Drill Drawing:
  lines w0.1: -6.9,-18.7 -6.9,-25 6.9,-25 6.9,-3 0,-3 0,3 6.9,3 6.9,25 -6.9,25 -6.9,19.6
  text "PRESS-FIT TECHNOLOGY diam. 0.6mm +0.05 -0" at -7.3,-17.975 h1
3D body "FCI_HM2P07PDG1A1N9LF.stp": height 13.45, standoff -3.3, extent -7.7,-25.4 7.7,25

## FCI_HM2P70PDE121N9LF [mm] "110+44 Contacts, 22 positions x 5 Rows  (a,b,c,d,e) + 2  Rows (z,f), Pitch 2 mm,  Press-Fit, Straight Hard Metric Male Connector, Millipacs, Type B22"
height 13.6
pads (154):
  round 1.1 hole 0.6: a1(-4,21) a2(-4,19) a3(-4,17) a4(-4,15) a5(-4,13) a6(-4,11) a7(-4,9) a8(-4,7) a9(-4,5) a10(-4,3) a11(-4,1) a12(-4,-1) a13(-4,-3) a14(-4,-5) a15(-4,-7) a16(-4,-9) a17(-4,-11) a18(-4,-13) a19(-4,-15) a20(-4,-17) a21(-4,-19) a22(-4,-21) b1(-2,21) b2(-2,19) b3(-2,17) b4(-2,15) b5(-2,13) b6(-2,11) b7(-2,9) b8(-2,7) b9(-2,5) b10(-2,3) b11(-2,1) b12(-2,-1) b13(-2,-3) b14(-2,-5) b15(-2,-7) b16(-2,-9) b17(-2,-11) b18(-2,-13) b19(-2,-15) b20(-2,-17) b21(-2,-19) b22(-2,-21) c1(0,21) c2(0,19) c3(0,17) c4(0,15) c5(0,13) c6(0,11) c7(0,9) c8(0,7) c9(0,5) c10(0,3) c11(0,1) c12(0,-1) c13(0,-3) c14(0,-5) c15(0,-7) c16(0,-9) c17(0,-11) c18(0,-13) c19(0,-15) c20(0,-17) c21(0,-19) c22(0,-21) d1(2,21) d2(2,19) d3(2,17) d4(2,15) d5(2,13) d6(2,11) d7(2,9) d8(2,7) d9(2,5) d10(2,3) d11(2,1) d12(2,-1) d13(2,-3) d14(2,-5) d15(2,-7) d16(2,-9) d17(2,-11) d18(2,-13) d19(2,-15) d20(2,-17) d21(2,-19) d22(2,-21) e1(4,21) e2(4,19) e3(4,17) e4(4,15) e5(4,13) e6(4,11) e7(4,9) e8(4,7) e9(4,5) e10(4,3) e11(4,1) e12(4,-1) e13(4,-3) e14(4,-5) e15(4,-7) e16(4,-9) e17(4,-11) e18(4,-13) e19(4,-15) e20(4,-17) e21(4,-19) e22(4,-21) f1(6,21) f2(6,19) f3(6,17) f4(6,15) f5(6,13) f6(6,11) f7(6,9) f8(6,7) f9(6,5) f10(6,3) f11(6,1) f12(6,-0.998) f13(6,-3) f14(6,-4.998) f15(6,-7) f16(6,-9) f17(6,-11) f18(6,-13) f19(6,-15) f20(6,-17) f21(6,-19) f22(6,-21) z1(-6,21) z2(-6,19) z3(-6,17) z4(-6,15) z5(-6,13) z6(-6,11) z7(-6,9) z8(-6,7) z9(-6,5) z10(-6,3) z11(-6,1) z12(-6,-1) z13(-6,-3) z14(-6,-5) z15(-6,-7) z16(-6,-9) z17(-6,-11) z18(-6,-13) z19(-6,-15) z20(-6,-17) z21(-6,-19) z22(-6,-21)
Top Overlay:
  lines w0.2: -7.25,-22.4 -7.25,21.5 ; -6.95,-22.4 -6.95,21.5 ; -6.9,21.55 -6.9,-22.4 ; 6.9,21.55 6.9,-22.4 ; 6.95,-22.4 6.95,21.5 ; 7.25,-22.4 7.25,21.5 ; -6.95,21.5 -6.45,22 6.45,22 6.95,21.5 ; -6.95,21.5 -7.7,21.5 -7.7,-22.4 -6.9,-22.4 ; -6.9,-22.4 -6.5,-22 6.5,-22 6.9,-22.4 ; 6.9,-22.4 7.7,-22.4 7.7,21.5 6.95,21.5
  text "15" at -9.925,-7.558 h1.2
  text "22" at -10.1,-21.661 h1.2
  text "1" at -8.45,20.475 h1.2
  text "11" at -9.525,0.342 h1.2
  text "z" at -6.363,22.525 h1.5
  text "f" at 5.637,22.5 h1.5
  text "e" at 3.667,22.517 h1.5
  text "d" at 1.667,22.5 h1.5
  text "c" at -0.333,22.517 h1.5
  text "b" at -2.333,22.5 h1.5
  text "a" at -4.333,22.517 h1.5
Mechanical 8:
  drawing of 620 lines, arcs and shapes, not listed
Mechanical 14:
  drawing of 760 lines, arcs and shapes, not listed
  text "15" at -9.925,-7.558 h1.2
  text "22" at -10.1,-21.661 h1.2
  text "11" at -9.525,0.342 h1.2
  text "1" at -8.45,20.475 h1.2
  text "z" at -6.363,22.525 h1.5
  text "f" at 5.637,22.5 h1.5
  text "e" at 3.667,22.517 h1.5
  text "d" at 1.667,22.5 h1.5
  text "c" at -0.333,22.517 h1.5
  text "b" at -2.333,22.5 h1.5
  text "a" at -4.333,22.517 h1.5
Drill Drawing:
  lines w0.1: -6.9,-18.7 -6.9,-22 6.9,-22 6.9,22 -6.9,22 -6.9,19.7
  text "PRESS-FIT TECHNOLOGY diam. 0.6mm +0.05 -0" at -7.2,-17.775 h1
3D body "FCI_HM2P70PDE121N9LF.stp": height 13.45, standoff -3.3, extent -7.7,-22.4 7.7,22

## FCI_HM2R01PA5108N9LF [mm] "110+13 Contacts, 22 positions x 5 Rows (a,b,c,d,e) in Two Part + Shield  Row (f) 13 Positions, Pitch 2 mm,  Press-Fit, Right Angle Hard Metric Female Connector, Millipacs, Type A"
height 12.25
pads (125):
  round 1.1 hole 0.6: a1(5,24) a2(5,22) a3(5,20) a4(5,18) a5(5,16) a6(5,14) a7(5,12) a8(5,10) a9(5,8) a10(5,6) a11(5,4) a15(5,-4) a16(5,-6) a17(5,-8) a18(5,-10) a19(5,-12) a20(5,-14) a21(5,-16) a22(5,-18) a23(5,-20) a24(5,-22) a25(5,-24) b1(3,24) b2(3,22) b3(3,20) b4(3,18) b5(3,16) b6(3,14) b7(3,12) b8(3,10) b9(3,8) b10(3,6) b11(3,4) b15(3,-4) b16(3,-6) b17(3,-8) b18(3,-10) b19(3,-12) b20(3,-14) b21(3,-16) b22(3,-18) b23(3,-20) b24(3,-22) b25(3,-24) c1(1,24) c2(1,22) c3(1,20) c4(1,18) c5(1,16) c6(1,14) c7(1,12) c8(1,10) c9(1,8) c10(1,6) c11(1,4) c15(1,-4) c16(1,-6) c17(1,-8) c18(1,-10) c19(1,-12) c20(1,-14) c21(1,-16) c22(1,-18) c23(1,-20) c24(1,-22) c25(1,-24) d1(-1,24) d2(-1,22) d3(-1,20) d4(-1,18) d5(-1,16) d6(-1,14) d7(-1,12) d8(-1,10) d9(-1,8) d10(-1,6) d11(-1,4) d15(-1,-4) d16(-1,-6) d17(-1,-8) d18(-1,-10) d19(-1,-12) d20(-1,-14) d21(-1,-16) d22(-1,-18) d23(-1,-20) d24(-1,-22) d25(-1,-24) e1(-3,24) e2(-3,22) e3(-3,20) e4(-3,18) e5(-3,16) e6(-3,14) e7(-3,12) e8(-3,10) e9(-3,8) e10(-3,6) e11(-3,4) e15(-3,-4) e16(-3,-6) e17(-3,-8) e18(-3,-10) e19(-3,-12) e20(-3,-14) e21(-3,-16) e22(-3,-18) e23(-3,-20) e24(-3,-22) e25(-3,-24) f1(-5,24) f3(-5,20) f5(-5,16) f7(-5,12) f9(-5,8) f11(-5,4) f13(-5,0) f15(-5,-4) f17(-5,-8) f19(-5,-12) f21(-5,-16) f23(-5,-20) f25(-5,-24)
  round 1 hole 2 unplated mask+0.5: MECH1(-3,0) MECH2(3,0)
Top Overlay:
  lines w0.2: -5.15,-25 15.8,-25 15.8,-1.825 ; -5.15,-23 -5.15,-21 ; -5.15,-19 -5.15,-17 ; -5.15,-15 -5.15,-13 ; -5.15,-11 -5.15,-9 ; -5.15,-7 -5.15,-5 ; -5.15,-3 -5.15,-1 ; -5.15,1 -5.15,3 ; -5.15,5 -5.15,7 ; -5.15,9 -5.15,11 ; -5.15,13 -5.15,15 ; -5.15,17 -5.15,19 ; -5.15,21 -5.15,23 ; -5.15,25 15.8,25 15.8,1.825 ; 8,-2.464 15.8,-2.464 ; 8,-1.824 17.4,-1.825 18.65,-0.575 18.65,0.575 17.4,1.825 8,1.825 ; 8,2.464 15.8,2.464 ; 15.1,-25 15.1,-3.05 ; 15.1,-23.45 9.65,-23.45 9.65,-22.55 15.1,-22.55 ; 15.1,-21.45 9.65,-21.45 9.65,-20.55 15.1,-20.55 ; 15.1,-19.45 9.65,-19.45 9.65,-18.55 15.1,-18.55 ; 15.1,-17.45 9.65,-17.45 9.65,-16.55 15.1,-16.55 ; 15.1,-15.45 9.65,-15.45 9.65,-14.55 15.1,-14.55 ; 15.1,-13.45 9.65,-13.45 9.65,-12.55 15.1,-12.55 ; 15.1,-11.45 9.65,-11.45 9.65,-10.55 15.1,-10.55 ; 15.1,-9.45 9.65,-9.45 9.65,-8.55 15.1,-8.55 ; 15.1,-7.45 9.65,-7.45 9.65,-6.55 15.1,-6.55 ; 15.1,-5.45 9.65,-5.45 9.65,-4.55 15.1,-4.55 ; 15.1,3.05 15.1,25 ; 15.1,4.55 9.65,4.55 9.65,5.45 15.1,5.45 ; 15.1,6.55 9.65,6.55 9.65,7.45 15.1,7.45 ; 15.1,8.55 9.65,8.55 9.65,9.45 15.1,9.45 ; 15.1,10.55 9.65,10.55 9.65,11.45 15.1,11.45 ; 15.1,12.55 9.65,12.55 9.65,13.45 15.1,13.45 ; 15.1,14.55 9.65,14.55 9.65,15.45 15.1,15.45 ; 15.1,16.55 9.65,16.55 9.65,17.45 15.1,17.45 ; 15.1,18.55 9.65,18.55 9.65,19.45 15.1,19.45 ; 15.1,20.55 9.65,20.55 9.65,21.45 15.1,21.45 ; 15.1,22.55 9.65,22.55 9.65,23.45 15.1,23.45 ; 15.8,-3.05 8,-3.05 8,3.05 15.8,3.05 ; 17.325,-1.825 17.325,1.825 ; 17.75,-1.5 19,-0.25 19,0.25 17.75,1.5
  text "a" at 4.667,25.492 h1.5
  text "e" at -3.333,25.542 h1.5
  text "d" at -1.333,25.5 h1.5
  text "c" at 0.692,25.492 h1.5
  text "b" at 2.667,25.5 h1.5
  text "f" at -5.363,25.5 h1.5
  text "1" at -5.975,23.8 h1.2
  text "11" at -5.975,3.217 h1.2
  text "20" at -5.975,-14.783 h1.2
  text "25" at -5.975,-24.783 h1.2
Mechanical 8:
  drawing of 506 lines, arcs and shapes, not listed
Mechanical 14:
  lines w0.1: 8,-2.464 15.8,-2.464 ; 8,-1.824 17.4,-1.825 18.65,-0.575 18.65,0.575 17.4,1.825 8,1.825 ; 8,2.464 15.8,2.464 ; 15.1,-25 15.1,-3.05 ; 15.1,-23.45 9.65,-23.45 9.65,-22.55 15.1,-22.55 ; 15.1,-21.45 9.65,-21.45 9.65,-20.55 15.1,-20.55 ; 15.1,-19.45 9.65,-19.45 9.65,-18.55 15.1,-18.55 ; 15.1,-17.45 9.65,-17.45 9.65,-16.55 15.1,-16.55 ; 15.1,-15.45 9.65,-15.45 9.65,-14.55 15.1,-14.55 ; 15.1,-13.45 9.65,-13.45 9.65,-12.55 15.1,-12.55 ; 15.1,-11.45 9.65,-11.45 9.65,-10.55 15.1,-10.55 ; 15.1,-9.45 9.65,-9.45 9.65,-8.55 15.1,-8.55 ; 15.1,-7.45 9.65,-7.45 9.65,-6.55 15.1,-6.55 ; 15.1,-5.45 9.65,-5.45 9.65,-4.55 15.1,-4.55 ; 15.1,3.05 15.1,25 ; 15.1,4.55 9.65,4.55 9.65,5.45 15.1,5.45 ; 15.1,6.55 9.65,6.55 9.65,7.45 15.1,7.45 ; 15.1,8.55 9.65,8.55 9.65,9.45 15.1,9.45 ; 15.1,10.55 9.65,10.55 9.65,11.45 15.1,11.45 ; 15.1,12.55 9.65,12.55 9.65,13.45 15.1,13.45 ; 15.1,14.55 9.65,14.55 9.65,15.45 15.1,15.45 ; 15.1,16.55 9.65,16.55 9.65,17.45 15.1,17.45 ; 15.1,18.55 9.65,18.55 9.65,19.45 15.1,19.45 ; 15.1,20.55 9.65,20.55 9.65,21.45 15.1,21.45 ; 15.1,22.55 9.65,22.55 9.65,23.45 15.1,23.45 ; 15.8,-3.05 8,-3.05 8,3.05 15.8,3.05 ; 15.8,-1.825 15.8,-25 -5.15,-25 -5.15,25 15.8,25 15.8,1.825 ; 17.325,-1.825 17.325,1.825 ; 17.75,-1.5 19,-0.25 19,0.25 17.75,1.5
  text "a" at 4.667,25.492 h1.5
  text "b" at 2.667,25.5 h1.5
  text "c" at 0.692,25.492 h1.5
  text "d" at -1.333,25.5 h1.5
  text "e" at -3.333,25.542 h1.5
  text "f" at -5.363,25.5 h1.5
  text "25" at -5.975,-24.783 h1.2
  text "20" at -5.975,-14.783 h1.2
  text "11" at -5.975,3.217 h1.2
  text "1" at -5.975,23.8 h1.2
Drill Drawing:
  lines w0.1: -6.25,-18.7 -6.25,-25 6.15,-25 6.15,-2.475 -5.15,-2.475 -5.15,2.475 6.15,2.475 6.15,25 -6.25,25 -6.25,19.6
  text "PRESS-FIT TECHNOLOGY diam. 0.6mm +0.05 -0" at -6.1,-17.85 h1
3D body "FCI_HM2R01PA5108N9LF.stp": height 8.13, standoff -4.13, extent -5.15,-25 19,25

## FCI_HM2R70PA5108N9LF [mm] "110+11 Contacts, 22 positions x 5 Rows  (a,b,c,d,e) +  Shield  Row (f) 11 Positions, Pitch 2 mm,  Press-Fit, Right Angle Hard Metric Female Connector, Millipacs, Type B22"
height 11.4
pads (121):
  round 1.1 hole 0.6: a1(4,21) a2(4,19) a3(4,17) a4(4,15) a5(4,13) a6(4,11) a7(4,9) a8(4,7) a9(4,5) a10(4,3) a11(4,1) a12(4,-1) a13(4,-3) a14(4,-5) a15(4,-7) a16(4,-9) a17(4,-11) a18(4,-13) a19(4,-15) a20(4,-17) a21(4,-19) a22(4,-21) b1(2,21) b2(2,19) b3(2,17) b4(2,15) b5(2,13) b6(2,11) b7(2,9) b8(2,7) b9(2,5) b10(2,3) b11(2,1) b12(2,-1) b13(2,-3) b14(2,-5) b15(2,-7) b16(2,-9) b17(2,-11) b18(2,-13) b19(2,-15) b20(2,-17) b21(2,-19) b22(2,-21) c1(0,21) c2(0,19) c3(0,17) c4(0,15) c5(0,13) c6(0,11) c7(0,9) c8(0,7) c9(0,5) c10(0,3) c11(0,1) c12(0,-1) c13(0,-3) c14(0,-5) c15(0,-7) c16(0,-9) c17(0,-11) c18(0,-13) c19(0,-15) c20(0,-17) c21(0,-19) c22(0,-21) d1(-2,21) d2(-2,19) d3(-2,17) d4(-2,15) d5(-2,13) d6(-2,11) d7(-2,9) d8(-2,7) d9(-2,5) d10(-2,3) d11(-2,1) d12(-2,-1) d13(-2,-3) d14(-2,-5) d15(-2,-7) d16(-2,-9) d17(-2,-11) d18(-2,-13) d19(-2,-15) d20(-2,-17) d21(-2,-19) d22(-2,-21) e1(-4,21) e2(-4,19) e3(-4,17) e4(-4,15) e5(-4,13) e6(-4,11) e7(-4,9) e8(-4,7) e9(-4,5) e10(-4,3) e11(-4,1) e12(-4,-1) e13(-4,-3) e14(-4,-5) e15(-4,-7) e16(-4,-9) e17(-4,-11) e18(-4,-13) e19(-4,-15) e20(-4,-17) e21(-4,-19) e22(-4,-21) f1(-6,21) f3(-6,17) f5(-6,13) f7(-6,9) f9(-6,5) f11(-6,1) f13(-6,-3) f15(-6,-7) f17(-6,-11) f19(-6,-15) f21(-6,-19)
Top Overlay:
  lines w0.2: -6.15,-20 -6.15,-22 14.8,-22 14.8,22 -6.15,22 ; -6.15,-18.002 -6.15,-16.002 ; -6.15,-14.002 -6.15,-12.002 ; -6.15,-10.002 -6.15,-8.002 ; -6.15,-6.002 -6.15,-4.002 ; -6.15,-2.002 -6.15,-0.002 ; -6.15,1.998 -6.15,3.998 ; -6.15,5.998 -6.15,7.998 ; -6.15,9.998 -6.15,11.998 ; -6.15,13.998 -6.15,15.998 ; -6.15,17.998 -6.15,19.998 ; 7,-22 7,22 ; 14.1,-22 14.1,22 ; 14.1,-20.45 8.65,-20.45 8.65,-19.55 14.1,-19.55 ; 14.1,-18.45 8.65,-18.45 8.65,-17.55 14.1,-17.55 ; 14.1,-16.45 8.65,-16.45 8.65,-15.55 14.1,-15.55 ; 14.1,-14.45 8.65,-14.45 8.65,-13.55 14.1,-13.55 ; 14.1,-12.45 8.65,-12.45 8.65,-11.55 14.1,-11.55 ; 14.1,-10.45 8.65,-10.45 8.65,-9.55 14.1,-9.55 ; 14.1,-8.45 8.65,-8.45 8.65,-7.55 14.1,-7.55 ; 14.1,-6.45 8.65,-6.45 8.65,-5.55 14.1,-5.55 ; 14.1,-4.45 8.65,-4.45 8.65,-3.55 14.1,-3.55 ; 14.1,-2.45 8.65,-2.45 8.65,-1.55 14.1,-1.55 ; 14.1,-0.45 8.65,-0.45 8.65,0.45 14.1,0.45 ; 14.1,1.55 8.65,1.55 8.65,2.45 14.1,2.45 ; 14.1,3.55 8.65,3.55 8.65,4.45 14.1,4.45 ; 14.1,5.55 8.65,5.55 8.65,6.45 14.1,6.45 ; 14.1,7.55 8.65,7.55 8.65,8.45 14.1,8.45 ; 14.1,9.55 8.65,9.55 8.65,10.45 14.1,10.45 ; 14.1,11.55 8.65,11.55 8.65,12.45 14.1,12.45 ; 14.1,13.55 8.65,13.55 8.65,14.45 14.1,14.45 ; 14.1,15.55 8.65,15.55 8.65,16.45 14.1,16.45 ; 14.1,17.55 8.65,17.55 8.65,18.45 14.1,18.45 ; 14.1,19.55 8.65,19.55 8.65,20.45 14.1,20.45
  text "15" at -6.975,-7.783 h1.2
  text "22" at -6.975,-21.786 h1.2
  text "a" at 3.592,22.517 h1.5
  text "e" at -4.333,22.667 h1.5
  text "d" at -2.333,22.5 h1.5
  text "c" at -0.333,22.667 h1.5
  text "b" at 1.667,22.5 h1.5
  text "f" at -6.363,22.5 h1.5
  text "1" at -6.975,20.8 h1.2
  text "11" at -6.975,0.217 h1.2
Mechanical 8:
  drawing of 490 lines, arcs and shapes, not listed
Mechanical 14:
  lines w0.1: -6.15,-22 14.8,-22 14.8,22 -6.15,22 ; 7,-22 7,22 ; 14.1,-22 14.1,22 ; 14.1,-20.45 8.65,-20.45 8.65,-19.55 14.1,-19.55 ; 14.1,-18.45 8.65,-18.45 8.65,-17.55 14.1,-17.55 ; 14.1,-16.45 8.65,-16.45 8.65,-15.55 14.1,-15.55 ; 14.1,-14.45 8.65,-14.45 8.65,-13.55 14.1,-13.55 ; 14.1,-12.45 8.65,-12.45 8.65,-11.55 14.1,-11.55 ; 14.1,-10.45 8.65,-10.45 8.65,-9.55 14.1,-9.55 ; 14.1,-8.45 8.65,-8.45 8.65,-7.55 14.1,-7.55 ; 14.1,-6.45 8.65,-6.45 8.65,-5.55 14.1,-5.55 ; 14.1,-4.45 8.65,-4.45 8.65,-3.55 14.1,-3.55 ; 14.1,-2.45 8.65,-2.45 8.65,-1.55 14.1,-1.55 ; 14.1,-0.45 8.65,-0.45 8.65,0.45 14.1,0.45 ; 14.1,1.55 8.65,1.55 8.65,2.45 14.1,2.45 ; 14.1,3.55 8.65,3.55 8.65,4.45 14.1,4.45 ; 14.1,5.55 8.65,5.55 8.65,6.45 14.1,6.45 ; 14.1,7.55 8.65,7.55 8.65,8.45 14.1,8.45 ; 14.1,9.55 8.65,9.55 8.65,10.45 14.1,10.45 ; 14.1,11.55 8.65,11.55 8.65,12.45 14.1,12.45 ; 14.1,13.55 8.65,13.55 8.65,14.45 14.1,14.45 ; 14.1,15.55 8.65,15.55 8.65,16.45 14.1,16.45 ; 14.1,17.55 8.65,17.55 8.65,18.45 14.1,18.45 ; 14.1,19.55 8.65,19.55 8.65,20.45 14.1,20.45
  text "15" at -6.975,-7.783 h1.2
  text "22" at -6.975,-21.786 h1.2
  text "a" at 3.592,22.517 h1.5
  text "b" at 1.667,22.5 h1.5
  text "c" at -0.333,22.667 h1.5
  text "d" at -2.333,22.5 h1.5
  text "e" at -4.333,22.667 h1.5
  text "f" at -6.363,22.5 h1.5
  text "11" at -6.975,0.217 h1.2
  text "1" at -6.975,20.8 h1.2
Drill Drawing:
  lines w0.1: -6.975,-19.3 -6.975,-22 5.225,-22 5.225,22 -6.975,22 -6.975,19.075
  text "PRESS-FIT TECHNOLOGY diam. 0.6mm +0.05 -0" at -7.25,-18.175 h1
3D body "FCI_HM2R70PA5108N9LF.stp": height 7.7, standoff -3.7, extent -6.15,-22 14.8,22